# Altium footprint library tianxiaohua_PcbLib.PcbLib: 138 footprints (part 5 of 9)
Each footprint in its own frame and in the unit in brackets; x right, y up, seen from the top. Pads: shape width x height; smd on the part's side, far side on the other; paste and mask are expansions set on the pad; w line width, h text height; cw(c..) or ccw(c..) is an arc to the next point about the centre after c.
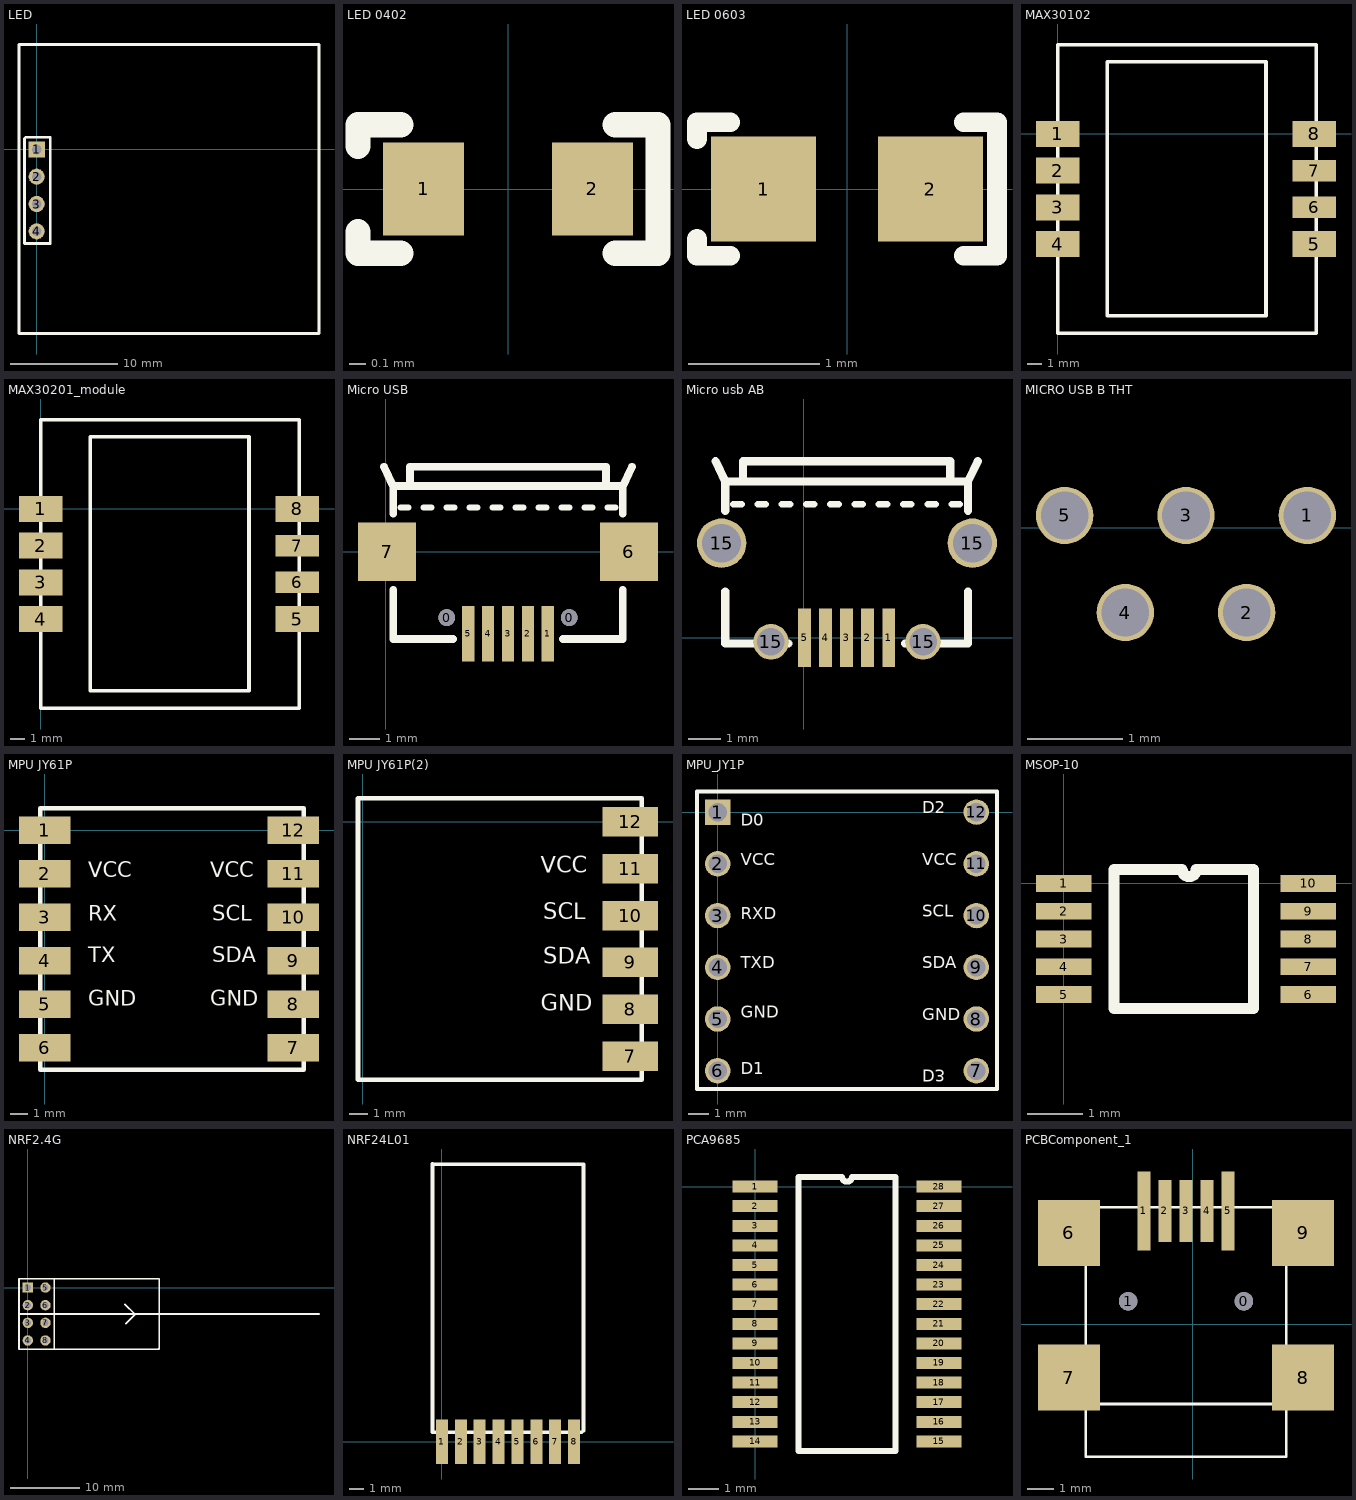
[diagram p4: the footprints below, top view; thin cyan lines are the x and y axes]

## LED [mm]
pads (4):
  rect 1.5x1.5 hole 0.9: 1(0,0)
  round 1.5 hole 0.9: 2(0,-2.54) 3(0,-5.08) 4(0,-7.62)
Top Overlay:
  lines w0.254: -1.651,-17.145 -1.651,9.779 26.162,9.779 ; -1.524,-17.145 26.289,-17.145 26.289,9.779 ; -1.143,-8.763 1.27,-8.763 1.27,1.143 -1.016,1.143 -1.143,1.016 -1.143,-8.763
3D body: height 10, standoff 0, extent -0.496,-8.119 0.5,-7.121
3D body: height 10, standoff 0, extent -0.496,-5.579 0.5,-4.581
3D body: height 10, standoff 0, extent -0.496,-3.039 0.5,-2.041
3D body: height 10, standoff 0, extent -0.496,-0.499 0.5,0.499
3D body: height 10, standoff 8, extent -1.713,-17.145 26.162,9.652

## LED 0402 [mm]
pads (2):
  rect 0.48x0.55 smd: 1(-0.5,0) 2(0.5,0)
Top Overlay:
  lines w0.15: -0.889,-0.254 -0.889,-0.381 -0.635,-0.381 ; -0.889,0.254 -0.889,0.381 -0.635,0.381 ; 0.635,-0.381 0.889,-0.381 0.889,0.381 0.635,0.381
3D body "User Library-LED_1006_W.STEP": height 0.2, standoff 0, extent -0.5,-0.3 0.5,0.3

## LED 0603 [mm]
pads (2):
  rect 0.8x0.8 smd: 1(-0.635,0) 2(0.635,0)
Top Overlay:
  lines w0.15: -1.143,-0.381 -1.143,-0.508 -0.889,-0.508 ; -1.143,0.381 -1.143,0.508 -0.889,0.508 ; 0.889,-0.508 1.143,-0.508 1.143,0.508 0.889,0.508
3D body "User Library-LED_0603_WS.STEP": height 0.6, standoff 0, extent -0.8,-0.4 0.8,0.4

## MAX30102 [mm] "血氧传感器模块"
pads (8):
  rect 3x1.8 smd: 1(0,0) 2(0,-2.54) 3(0,-5.08) 4(0,-7.62) 5(17.78,-7.62) 8(17.78,0)
  rect 3x1.5 smd: 6(17.78,-5.08) 7(17.78,-2.54)
Top Overlay:
  lines w0.254: 0,-13.81 0,-3.81 0,6.19 17.907,6.19 17.907,-3.81 17.907,-13.81 0,-13.81 ; 3.429,-12.59 3.429,-7.59 3.429,0 3.429,5 14.429,5 14.429,0 14.429,-7.59 14.429,-12.59 3.429,-12.59
3D body: height 1, standoff -1, extent 3.683,-12.319 14.097,4.699
3D body: height 1, standoff 0, extent 0,-13.716 17.907,6.223

## MAX30201_module [mm] "血氧传感器模块"
pads (8):
  rect 3x1.8 smd: 1(0,0) 2(0,-2.54) 3(0,-5.08) 4(0,-7.62) 5(17.78,-7.62) 8(17.78,0)
  rect 3x1.5 smd: 6(17.78,-5.08) 7(17.78,-2.54)
Top Overlay:
  lines w0.254: 0,-13.81 17.907,-13.81 17.907,-3.81 17.907,6.19 0,6.19 0,-3.81 0,-13.81 ; 3.429,-12.59 14.429,-12.59 14.429,-7.59 14.429,0 14.429,5 3.429,5 3.429,0 3.429,-7.59 3.429,-12.59
3D body: height 1, standoff 0, extent 0,-13.716 17.907,6.223
3D body: height 2, standoff 1, extent 3.683,-12.319 14.097,4.699

## Micro USB [mm]
pads (9):
  round 0.55 hole 0.55 unplated: 0(1.994,-2.15) 0(5.994,-2.15)
  rect 0.4x1.8 smd: 1(5.294,-2.675) 2(4.644,-2.675) 3(3.994,-2.675) 4(3.344,-2.675) 5(2.694,-2.675)
  rect 1.9x1.9 smd: 6(7.944,0) 7(0.044,0)
Top Overlay:
  lines w0.203: 0.494,1.45 0.744,1.45 ; 1.244,1.45 1.494,1.45 ; 1.994,1.45 2.244,1.45 ; 2.744,1.45 2.994,1.45 ; 3.494,1.45 3.744,1.45 ; 4.244,1.45 4.494,1.45 ; 4.994,1.45 5.244,1.45 ; 5.744,1.45 5.994,1.45 ; 6.494,1.45 6.744,1.45 ; 7.244,1.45 7.494,1.45
  lines w0.254: -0.056,2.78 0.244,2.15 ; 0.244,-1.25 0.244,-2.85 2.194,-2.85 ; 0.244,1.25 0.244,1.45 0.244,2.15 ; 0.794,2.15 0.794,2.78 7.194,2.78 7.194,2.15 ; 5.794,-2.85 7.744,-2.85 7.744,-1.25 ; 7.744,1.25 7.744,1.45 7.744,2.15 ; 8.044,2.78 7.744,2.15 ; 0.244,2.15 7.744,2.15
3D body "Micro USB.STEP": height 2.72, standoff -0.22, extent 0.004,-2.85 7.984,2.58

## Micro usb AB [mm]
pads (9):
  rect 0.4x1.8 smd: 1(2.623,0) 2(1.973,0) 3(1.323,0) 4(0.673,0) 5(0.023,0)
  round 1.524 hole 1.2: 15(-2.54,2.921) 15(5.207,2.921)
  round 1.1 hole 0.85: 15(-1.016,-0.127) 15(3.683,-0.127)
Top Overlay:
  lines w0.203: -2.177,4.125 -1.927,4.125 ; -1.427,4.125 -1.177,4.125 ; -0.677,4.125 -0.427,4.125 ; 0.073,4.125 0.323,4.125 ; 0.823,4.125 1.073,4.125 ; 1.573,4.125 1.823,4.125 ; 2.323,4.125 2.573,4.125 ; 3.073,4.125 3.323,4.125 ; 3.823,4.125 4.073,4.125 ; 4.573,4.125 4.823,4.125
  lines w0.254: -2.727,5.455 -2.427,4.825 ; -2.427,1.425 -2.427,-0.175 -0.477,-0.175 ; -2.427,3.925 -2.427,4.125 -2.427,4.825 ; -1.877,4.825 -1.877,5.455 4.523,5.455 4.523,4.825 ; 3.123,-0.175 5.073,-0.175 5.073,1.425 ; 5.073,3.925 5.073,4.125 5.073,4.825 ; 5.373,5.455 5.073,4.825 ; -2.427,4.825 5.073,4.825
3D body "47590-0001.stp": height 2.81, standoff -0.55, extent -3.002,-0.276 5.648,5.624

## MICRO USB B THT [mm] "竖着的usb封装"
pads (5):
  round 0.6 hole 0.5: 1(4.953,0.127) 2(4.318,-0.889) 3(3.683,0.127) 4(3.048,-0.889) 5(2.413,0.127)
via 0,0 diameter 1.6 hole 1.45
via 7.239,0 diameter 1.6 hole 1.45
3D body "User Library-Micro USB B THT vertical.step": height 6.94, standoff -0.97, extent -0.342,-1.723 7.658,1.292

## MPU JY61P [mm]
pads (12):
  rect 3x1.6 smd: 1(0,0) 2(0,-2.54) 3(0,-5.08) 4(0,-7.62) 5(0,-10.16) 6(0,-12.7) 7(14.5,-12.7) 8(14.5,-10.16) 9(14.5,-7.62) 10(14.5,-5.08) 11(14.5,-2.54) 12(14.5,0)
Top Overlay:
  lines w0.254: -0.254,-13.97 -0.254,1.27 15.113,1.27 15.113,-13.97 -0.254,-13.97
  text "GND" at 9.652,-10.541 h1.52
  text "SDA" at 9.779,-8.001 h1.52
  text "SCL" at 9.779,-5.588 h1.52
  text "VCC" at 9.652,-3.048 h1.52
  text "GND" at 2.54,-10.541 h1.52
  text "TX" at 2.54,-8.001 h1.52
  text "RX" at 2.54,-5.588 h1.52
  text "VCC" at 2.54,-3.048 h1.52
3D body: height 2, standoff 0, extent 0,-13.716 14.732,1.016
3D body: height 0.25, standoff 0, extent -0.381,1.27 -0.381,1.27

## MPU JY61P(2) [mm]
pads (6):
  rect 3x1.6 smd: 7(14.5,-12.7) 8(14.5,-10.16) 9(14.5,-7.62) 10(14.5,-5.08) 11(14.5,-2.54) 12(14.5,0)
Top Overlay:
  lines w0.254: -0.254,-13.97 15.113,-13.97 15.113,1.27 -0.254,1.27 -0.254,-13.97
  text "VCC" at 9.652,-3.048 h1.52
  text "SCL" at 9.779,-5.588 h1.52
  text "SDA" at 9.779,-8.001 h1.52
  text "GND" at 9.652,-10.541 h1.52
3D body: height 0.25, standoff 0, extent -0.381,1.27 -0.381,1.27
3D body: height 2, standoff 0, extent 0,-13.716 14.732,1.016

## MPU_JY1P [mm]
pads (12):
  rect 1.25x1.25 hole 0.9: 1(0,0)
  round 1.25 hole 0.9: 2(0,-2.54) 3(0,-5.08) 4(0,-7.62) 5(0,-10.16) 6(0,-12.7) 7(12.7,-12.7) 8(12.7,-10.16) 9(12.7,-7.62) 10(12.7,-5.08) 11(12.7,-2.54) 12(12.7,0)
Top Overlay:
  lines w0.2: -1.016,-13.589 -1.016,1.016 13.716,1.016 13.716,-13.589 -1.016,-13.589
  text "D3" at 10.034,-12.446 h1
  text "GND" at 10.034,-10.414 h1
  text "SDA" at 10.033,-7.874 h1
  text "SCL" at 10.033,-5.334 h1
  text "VCC" at 10.033,-2.794 h1
  text "D2" at 10.034,-0.254 h1
  text "D1" at 1.143,-13.081 h1
  text "GND" at 1.143,-10.287 h1
  text "TXD" at 1.143,-7.874 h1
  text "RXD" at 1.143,-5.461 h1
  text "VCC" at 1.142,-2.794 h1
  text "D0" at 1.143,0.127 h1
3D body: height 11, standoff 10, extent -1.016,-13.716 13.716,1.016
3D body: height 10, standoff 0, extent 11.5,-1.2 13.9,1.2
3D body: height 10, standoff 0, extent 11.5,-3.74 13.9,-1.34
3D body: height 10, standoff 0, extent 11.5,-6.28 13.9,-3.88
3D body: height 10, standoff 0, extent 11.5,-8.82 13.9,-6.42
3D body: height 10, standoff 0, extent 11.5,-11.36 13.9,-8.96
3D body: height 10, standoff 0, extent 11.5,-13.9 13.9,-11.5
3D body: height 10, standoff 0, extent -1.2,-13.9 1.2,-11.5
3D body: height 10, standoff 0, extent -1.2,-11.36 1.2,-8.96
3D body: height 10, standoff 0, extent -1.2,-8.82 1.2,-6.42
3D body: height 10, standoff 0, extent -1.2,-6.28 1.2,-3.88
3D body: height 10, standoff 0, extent -1.2,-3.74 1.2,-1.34
3D body: height 10, standoff 0, extent -1.2,-1.2 1.2,1.2

## MSOP-10 [mm]
pads (10):
  rect 1x0.3 smd: 1(0,0) 2(0,-0.5) 3(0,-1) 4(0,-1.5) 5(0,-2) 6(4.403,-2) 7(4.403,-1.5) 8(4.403,-1) 9(4.403,-0.5) 10(4.403,0)
Top Overlay:
  lines w0.2: 0.903,-2.25 3.418,-2.25 3.418,0.25 2.382,0.25 cw(c2.258,0.25) 2.133,0.25 0.903,0.25 0.903,-2.25
3D body "User Library-MSOP-10-1.step": height 1.05, standoff 0, extent -0.321,-2.5 4.707,0.5

## NRF2.4G [mm]
pads (8):
  rect 1.5x1.5 hole 0.9: 1(0,0)
  round 1.5 hole 0.9: 2(0,-2.54) 3(0,-5.08) 4(0,-7.62) 5(2.54,0) 6(2.54,-2.54) 7(2.54,-5.08) 8(2.54,-7.62)
Top Overlay:
  lines w0.254: -1.27,-3.81 41.91,-3.81 ; 2.794,-8.89 18.796,-8.89 18.923,-8.763 ; 7.62,-3.81 15.367,-3.81 ; 13.97,-2.413 15.367,-3.81 ; 14.097,-5.207 15.367,-3.937 15.367,-3.81 ; 18.923,-8.89 18.923,1.27 -1.27,1.27 ; -1.27,1.27 -1.27,-8.89 3.81,-8.89 3.81,1.27 -1.27,1.27
3D body: height 10, standoff 8, extent -1.27,-9.017 32.131,1.27
3D body: height 8, standoff 0, extent -1,-0.999 1,0.999
3D body: height 8, standoff 0, extent 1.54,-0.999 3.54,0.999
3D body: height 8, standoff 0, extent -1,-3.539 1,-1.541
3D body: height 8, standoff 0, extent 1.54,-3.539 3.54,-1.541
3D body: height 8, standoff 0, extent -1,-6.079 1,-4.081
3D body: height 8, standoff 0, extent 1.54,-6.079 3.54,-4.081
3D body: height 8, standoff 0, extent -1,-8.619 1,-6.621
3D body: height 8, standoff 0, extent 1.54,-8.619 3.54,-6.621

## NRF24L01 [mm]
pads (8):
  rect 0.813x3 smd: 1(0,0) 2(1.27,0) 3(2.54,0) 4(3.81,0) 5(5.08,0) 6(6.35,0) 7(7.62,0) 8(8.89,0)
Top Overlay:
  lines w0.254: -0.635,0.635 9.398,0.635 ; -0.635,0.68 -0.635,18.68 ; -0.508,18.669 9.525,18.669 9.525,0.762
3D body: height 0.25, standoff 0, extent -0.762,0.381 9.398,18.415

## PCA9685 [mm]
pads (28):
  rect 1.5x0.4 smd: 1(0,0) 2(0,-0.65) 3(0,-1.3) 4(0,-1.95) 5(0,-2.6) 6(0,-3.25) 7(0,-3.9) 8(0,-4.55) 9(0,-5.2) 10(0,-5.85) 11(0,-6.5) 12(0,-7.15) 13(0,-7.8) 14(0,-8.45) 15(6.1,-8.45) 16(6.1,-7.8) 17(6.1,-7.15) 18(6.1,-6.5) 19(6.1,-5.85) 20(6.1,-5.2) 21(6.1,-4.55) 22(6.1,-3.9) 23(6.1,-3.25) 24(6.1,-2.6) 25(6.1,-1.95) 26(6.1,-1.3) 27(6.1,-0.65) 28(6.1,0)
Top Overlay:
  lines w0.2: 1.435,-8.775 4.665,-8.775 4.665,0.325 3.212,0.325 cw(c3.05,0.325) 2.887,0.325 1.435,0.325 1.435,-8.775
3D body: height 1.1, standoff 0, extent 0.889,-8.763 5.334,0.254
3D body: height 0.15, standoff 0, extent -0.508,-0.127 1.143,0.127
3D body: height 0.15, standoff 0, extent -0.508,-0.762 1.143,-0.508
3D body: height 0.15, standoff 0, extent -0.508,-1.397 1.143,-1.143
3D body: height 0.15, standoff 0, extent -0.508,-3.302 1.143,-3.048
3D body: height 0.15, standoff 0, extent -0.508,-2.667 1.143,-2.413
3D body: height 0.15, standoff 0, extent -0.508,-2.032 1.143,-1.778
3D body: height 0.15, standoff 0, extent -0.508,-5.334 1.143,-5.08
3D body: height 0.15, standoff 0, extent -0.508,-4.699 1.143,-4.445
3D body: height 0.15, standoff 0, extent -0.508,-4.064 1.143,-3.81
3D body: height 0.15, standoff 0, extent -0.508,-7.239 1.143,-6.985
3D body: height 0.15, standoff 0, extent -0.508,-6.604 1.143,-6.35
3D body: height 0.15, standoff 0, extent -0.508,-5.969 1.143,-5.715
3D body: height 0.15, standoff 0, extent 5.08,-2.667 6.731,-2.413
3D body: height 0.15, standoff 0, extent 5.08,-2.032 6.731,-1.778
3D body: height 0.15, standoff 0, extent 5.08,-1.397 6.731,-1.143
3D body: height 0.15, standoff 0, extent 5.08,-4.572 6.731,-4.318
3D body: height 0.15, standoff 0, extent 5.08,-3.937 6.731,-3.683
3D body: height 0.15, standoff 0, extent 5.08,-3.302 6.731,-3.048
3D body: height 0.15, standoff 0, extent 5.08,-6.604 6.731,-6.35
3D body: height 0.15, standoff 0, extent 5.08,-5.969 6.731,-5.715
3D body: height 0.15, standoff 0, extent 5.08,-5.334 6.731,-5.08
3D body: height 0.15, standoff 0, extent 5.08,-7.239 6.731,-6.985
3D body: height 0.15, standoff 0, extent 5.08,-7.874 6.731,-7.62
3D body: height 0.15, standoff 0, extent 5.08,-8.509 6.731,-8.255
3D body: height 0.15, standoff 0, extent -0.508,-8.509 1.143,-8.255
3D body: height 0.15, standoff 0, extent -0.508,-7.874 1.143,-7.62
3D body: height 0.15, standoff 0, extent 5.08,-0.762 6.731,-0.508
3D body: height 0.15, standoff 0, extent 5.08,-0.127 6.731,0.127

## PCBComponent_1 [mm]
pads (11):
  round 0.7 hole 0.7: 0(1.946,0.868) 1(-2.454,0.868)
  rect 0.5x3 smd: 1(-1.854,4.303) 5(1.346,4.303)
  rect 0.5x2.35 smd: 2(-1.054,4.303) 3(-0.254,4.303) 4(0.546,4.303)
  rect 2.35x2.5 smd: 6(-4.704,3.468) 7(-4.704,-2.032) 8(4.196,-2.032) 9(4.196,3.468)
Top Overlay:
  lines w0.1: -4.064,-3.032 3.556,-3.032 ; -4.064,-5.032 -4.064,-2.667 -4.064,4.445 3.556,4.445 3.556,-5.032 -4.064,-5.032
3D body: height 6.69, standoff 0, extent -4.114,-5.082 3.606,4.495